# Altium footprint library Semicon-Discrete.pcblib: 205 footprints (part 7 of 13)
Each footprint in its own frame and in the unit in brackets; x right, y up, seen from the top. Pads: shape width x height; smd on the part's side, far side on the other; paste and mask are expansions set on the pad; w line width, h text height; cw(c..) or ccw(c..) is an arc to the next point about the centre after c.
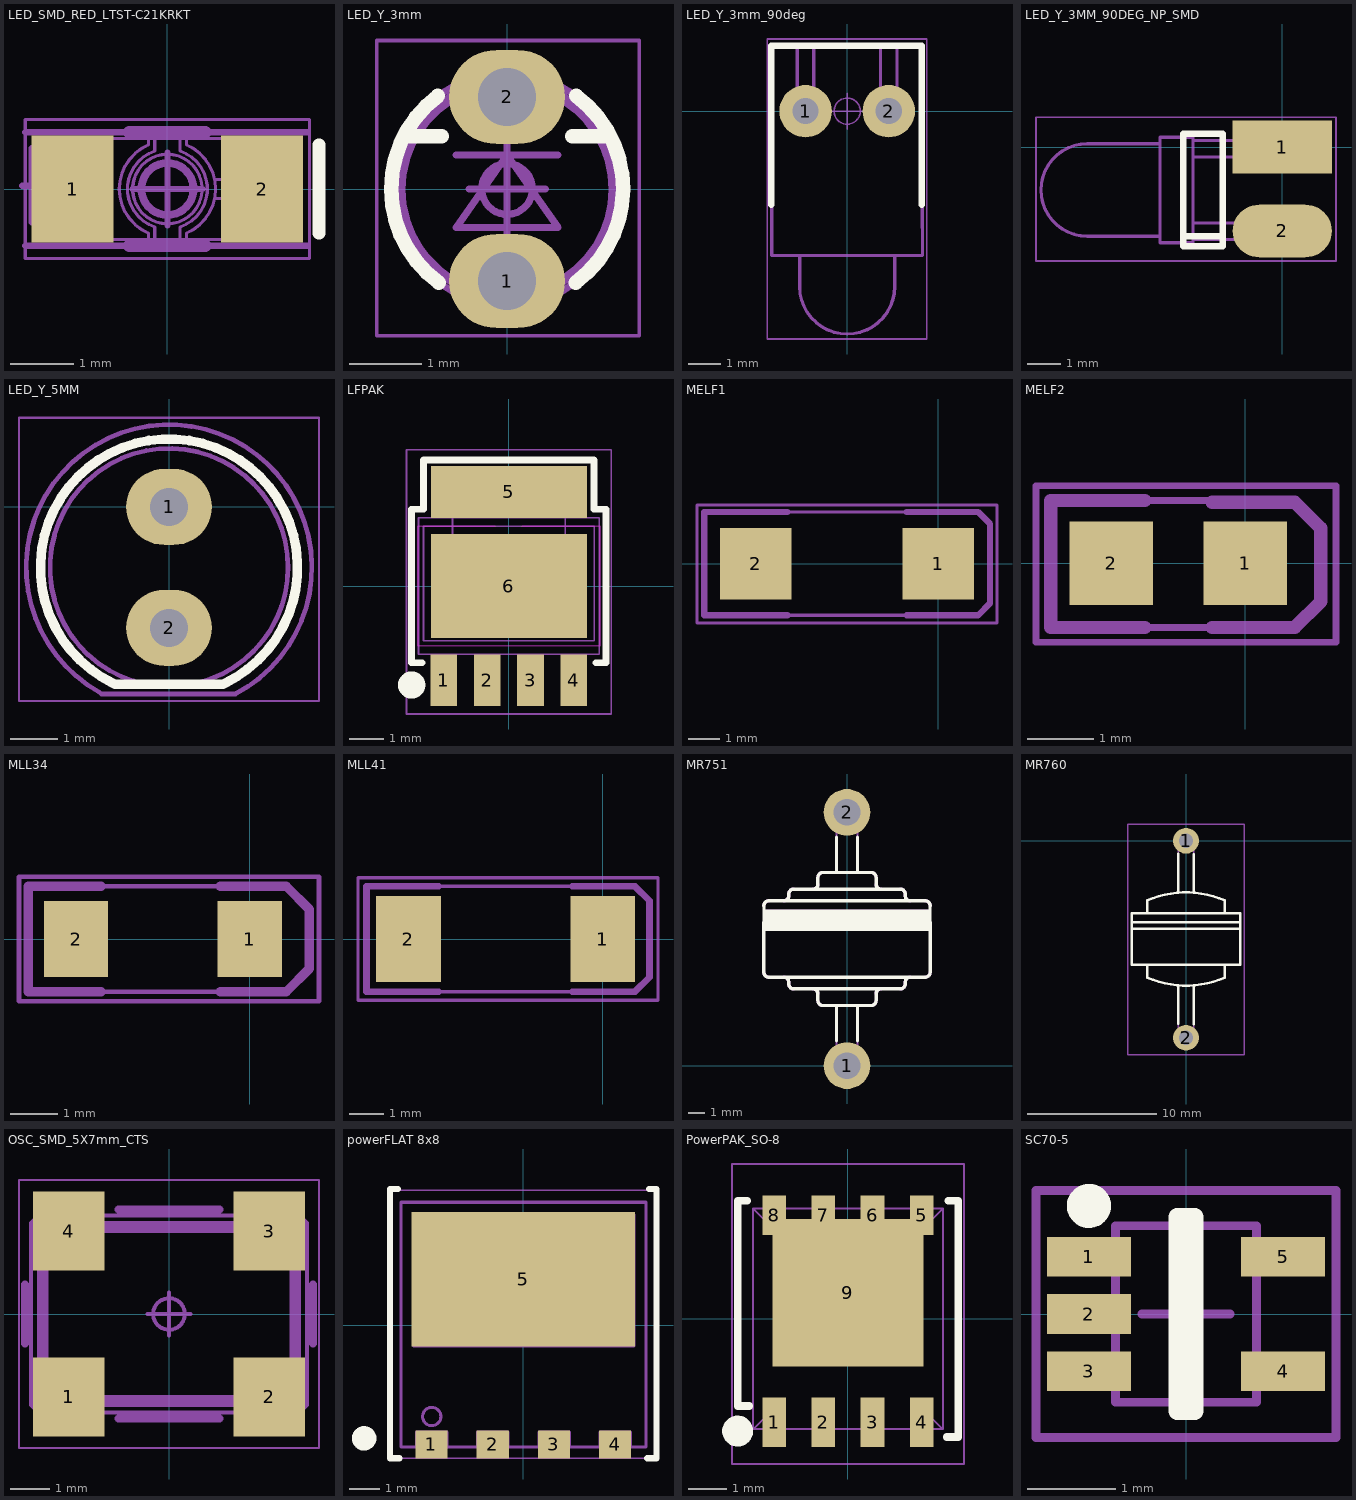
[diagram p6: the footprints below, top view; thin cyan lines are the x and y axes]

## LED_SMD_RED_LTST-C21KRKT [mm] "SMT,LED,1206,RED,Lite-On Inc. LTST-C21KRKT"
height 1.1
pads (2):
  rect 1.3x1.7 smd: 1(-1.5,0) 2(1.5,0)
TopOverlay:
  lines w0.2: 2.4,-0.7 2.4,0.7
2-TopCompOutl:
  lines w0.05: -1.7,-0.4 -1.7,0.5 ; -1,-0.8 -1,-0.7 ; -1,-0.6 -1,-0.4 ; -1,-0.3 -1,-0.1 ; -1,0 -1,0.2 ; -1,0.3 -1,0.5 ; -1,0.6 -1,0.8 ; -0.3,-0.8 -0.3,-0.7 cw(c0,0) -0.3,0.7 -0.3,0.8 ; -0.2,-0.8 -0.2,-0.6 cw(c0,0) -0.2,0.6 -0.2,0.8 ; 0.2,-0.8 0.2,-0.6 ccw(c0,0) 0.2,0.6 0.2,0.8 ; 0.3,-0.8 0.3,-0.7 ccw(c0,0) 0.3,0.7 0.3,0.8 ; 0.75,-0.15 1,-0.15 ; 0.75,0.15 1,0.15 ; 1,-0.8 1,-0.7 ; 1,-0.6 1,-0.4 ; 1,-0.3 1,-0.1 ; 1,0 1,0.2 ; 1,0.3 1,0.5 ; 1,0.6 1,0.8 ; -2.05,-0.4 -1.7,0.05 -2.05,0.5 -2.05,0.05 -2.05,-0.4 ; -1.6,-0.8 0,-0.8 1.6,-0.8 1.6,0 1.6,0.8 0,0.8 -1.6,0.8 -1.6,0 -1.6,-0.8 ; 0,-0.55 ccw(c0,0) 0,0.55 ccw(c0,0) 0,-0.55 ; 0,-0.45 ccw(c0,0) 0,0.45 ccw(c0,0) 0,-0.45
4-TopCourty:
  circle w0.1: c0,0 r0.4
  lines w0.05: -2.25,-1.1 -2.25,1.1 2.25,1.1 2.25,-1.1 -2.25,-1.1
  lines w0.1: -0.55,0 0.55,0 ; 0,-0.575 0,0.575
7-TopAssy:
  lines w0.1: -2.3,0.05 -1.45,0.05 ; -2.25,-0.9 2.225,-0.9 ; -2.25,0.9 2.225,0.9 ; -1.65,-0.55 -1.65,0.65 ; -2.15,-0.529 -2.15,0.15 -2.15,0.643 -1.694,0.057 -2.15,-0.529
  text ".Designator" at -1.3,-0.4 h1.6
13-SMDTopOverlay:
  lines w0.2: -0.6,-0.9 0.6,-0.9 ; -0.6,0.9 0.6,0.9
3D body "LED_SMD_RED_LTST-C21KRKT.STEP": height 1.1, standoff 0, extent -1.61,-0.8 1.61,0.8

## LED_Y_3mm [mm]
pads (2):
  oval 1.6x1.3 hole 0.8: 1(0,-1.27) 2(0,1.27)
TopOverlay:
  lines w0.2: -1.4,0.73 -0.9,0.73 ; -0.954,1.285 ccw(c0,0) -0.945,-1.291 ; 0.9,0.73 1.4,0.73 ; 0.945,-1.291 ccw(c0,0) 0.954,1.285
2-TopCompOutl:
  lines w0.1: -0.528,-1.404 cw(c0,0) 0.528,-1.404 ; -0.525,-1.405 0.525,-1.405
4-TopCourty:
  circle w0.1: c0,0 r0.35
  lines w0.05: -1.8,-2.025 1.825,-2.025 1.825,2.05 -1.8,2.05 -1.8,-2.025
  lines w0.1: -0.525,0 0.525,0 ; 0,-0.525 0,0.525
5-MCadOutl:
  lines w0.05: -0.3,0 0,0 ; 0,-0.229 0,0 ; 0,0.254 0,0 ; 0.3,0 0,0
7-TopAssy:
  circle w0.1: c0,-0.005 r1.45
  lines w0.1: -0.7,0.47 0.7,0.47 ; -0.563,-1.498 cw(c0,0) 0.563,-1.498 ; -0.55,-1.505 0.55,-1.505 ; 0,-0.83 0,0.87 ; -0.7,-0.53 0,0.47 0.7,-0.53 -0.7,-0.53 ; -0.25,-1.53 -0.25,-1.03 0.25,-1.03 0.25,-1.53 -0.25,-1.53 ; -0.25,1.02 0.25,1.02 0.25,1.52 -0.25,1.52 -0.25,1.02
  text ".Designator" at -1.65,2.35 h2.2
3D body "LED_Y_3mm.STEP": height 15.5, standoff -3.2, extent -1.597,-1.671 1.599,1.668

## LED_Y_3mm_90deg [mm]
pads (2):
  round 1.6 hole 0.8: 1(-1.27,0) 2(1.27,0)
TopOverlay:
  lines w0.2: -2.32,-2.85 -2.32,2 2.28,2 2.28,-2.85
2-TopCompOutl:
  drawing of 295 lines, arcs and shapes, not listed
4-TopCourty:
  circle w0.05: c0,0 r0.4
  lines w0.05: -0.575,0 0.575,0 ; 0,-0.55 0,0.55 ; -2.44,-6.95 -2.44,2.2 2.43,2.2 2.43,-6.95 -2.44,-6.95
7-TopAssy:
  lines w0.1: -1.45,-5.4 -1.45,-4.4 ; -1.45,-5.35 ccw(c0,-5.35) 1.45,-5.35 ; 1.45,-5.4 1.45,-4.4 ; -2.3,-4.4 2.3,-4.4 2.3,2 -2.3,2 -2.3,-4.4
  text ".Designator" at 0.53,-3.45 h2.2
3D body "LED_Y_3mm_90deg.STEP": height 7.3, standoff -3.5, extent -2.3,-6.8 2.3,1.95

## LED_Y_3MM_90DEG_NP_SMD [mm]
height 3
pads (2):
  rect 3x1.6 smd: 1(0,0)
  oval 3x1.6 smd: 2(0,-2.54)
TopOverlay:
  lines w0.2: -3,-2.7 -1.8,-2.7 ; -3,-3 -3,0.4 -1.8,0.4 -1.8,0 -1.8,-3 -3,-3
2-TopCompOutl:
  lines w0.1: -3.7,-2.7 -5.9,-2.7 cw(c-5.9,-1.3) -5.9,0.1 -3.7,0.1 -3.7,0.3 -2.7,0.3 -2.7,-2.9 -3.7,-2.9 -3.7,0.2 ; -2.7,-2.8 0.7,-2.8 0.7,-2.3 -2.7,-2.3 ; -2.7,-0.3 0.7,-0.3 0.7,0.2 -2.7,0.2
4-TopCourty:
  circle w0.1: c0,0 r0.4
  lines w0.05: -7.45,-3.45 1.625,-3.45 1.625,0.9 -7.45,0.9 -7.45,-3.45
  lines w0.1: -0.55,0 0.55,0 ; 0,-0.575 0,0.575
7-TopAssy:
  lines w0.1: -3.7,-2.7 -5.9,-2.7 cw(c-5.9,-1.3) -5.9,0.1 -3.7,0.1 -3.7,0.3 -2.7,0.3 -2.7,-2.9 -3.7,-2.9 -3.7,0.2 ; -2.7,-2.8 0.7,-2.8 0.7,-2.3 -2.7,-2.3 ; -2.7,-0.3 0.7,-0.3 0.7,0.2 -2.7,0.2
  text ".Designator" at -5.425,0.85 h2.2

## LED_Y_5MM [mm]
height 7
pads (2):
  oval 1.8x1.6 hole 0.8: 1(0,0) 2(0,-2.54)
TopOverlay:
  lines w0.2: -1.174,-3.701 cw(c0,-1.27) 1.174,-3.701 ; -1.14,-3.721 1.14,-3.721
  text ".Designator" at -2.2,2.02 h2.2
2-TopCompOutl:
  circle w0.1: c0,-1.27 r2.5
  lines w0.1: -1.454,-3.894 cw(c0,-1.27) 1.408,-3.919 ; -1.425,-3.925 1.4,-3.925
4-TopCourty:
  circle w0.1: c0,0 r0.35
  lines w0.05: -3.15,-4.075 -3.15,1.875 3.15,1.875 3.15,-4.075 -3.15,-4.075
  lines w0.1: -0.525,0 0.525,0 ; 0,-0.525 0,0.525
7-TopAssy:
  circle w0.1: c0,-1.27 r2.5
  lines w0.1: -1.454,-3.894 cw(c0,-1.27) 1.408,-3.919 ; -1.425,-3.925 1.4,-3.925
  text ".Designator" at -2.2,-1.9 h2.2
3D body "LED_Y_5mm.STEP": height 8.9, standoff -3.2, extent -2.793,-3.79 2.8,1.54

## LFPAK [mm] "LFPAK,SC-100"
height 1.1
pads (6):
  rect 0.78x1.52 smd: 1(-1.905,-2.76) 2(-0.635,-2.76) 3(0.635,-2.76) 4(1.905,-2.76)
  rect 4.57x1.52 smd: 5(0,2.76)
  rect 4.57x3.04 smd: 6(0,0)
TopLayer keep-out:
  lines w0.05: -0.4,1.75 -2.675,1.75 -2.675,-1.75 -0.025,-1.75 2.675,-1.75 2.675,1.75 0.4,1.75
TopOverlay:
  circle w0.4: c-2.85,-2.9 r0.2
  lines w0.2: -2.55,-2.25 -2.85,-2.25 -2.85,2.25 -2.5,2.25 -2.5,3.7 2.5,3.7 2.5,2.25 2.85,2.25 2.85,-2.25 2.55,-2.25
2-TopCompOutl:
  circle w0.05: c-1.85,-0.65 r0.4
  lines w0.05: -2.1,-3.1 -1.7,-3.1 ; -2.1,-2.7 -1.7,-2.7 ; -2.1,-2 -2.1,-3.3 -1.7,-3.3 -1.7,-2 ; -1.85,2 -1.85,2.25 -2,2.25 -2,2.9 ; -0.85,-3.1 -0.45,-3.1 ; -0.85,-2.7 -0.45,-2.7 ; -0.85,-2 -0.85,-3.3 -0.45,-3.3 -0.45,-2 ; -0.1,-1.6 2.5,-1.6 2.5,1.75 -0.1,1.75 ; 0.1,-1.6 -2.5,-1.6 -2.5,1.75 0.1,1.75 ; 0.45,-3.1 0.85,-3.1 ; 0.45,-2.7 0.85,-2.7 ; 0.45,-2 0.45,-3.3 0.85,-3.3 0.85,-2 ; 1.7,-3.1 2.1,-3.1 ; 1.7,-2.7 2.1,-2.7 ; 1.7,-2 1.7,-3.3 2.1,-3.3 2.1,-2 ; 1.85,2 1.85,2.25 2,2.25 2,2.9 ; -2,2.9 -1.9,3 0,3 1.9,3 2,2.9 ; -2,2.9 -2,2.9 ; 2,2.9 2,2.9 ; -2.65,-2 0,-2 2.65,-2 2.65,0 2.65,2 0,2 -2.65,2 -2.65,0 -2.65,-2
4-TopCourty:
  circle w0.1: c0,0 r0.35
  lines w0.05: -3,-3.75 -3,4 3,4 3,-3.75 -3,-3.75
  lines w0.1: -0.525,0 0.525,0 ; 0,-0.525 0,0.525
5-MCadOutl:
  lines w0.05: -2.15,2.15 -1.65,2.15 -1.65,-1.4 0,-1.4 1.65,-1.4 1.65,2.15 2.15,2.15 2.15,3.05 1.8,3.4 0,3.4 -1.8,3.4 -2.15,3.05 -2.15,2.15
7-TopAssy:
  circle w0.05: c-2,-1.05 r0.2
  lines w0.05: -2.1,-3.1 -1.7,-3.1 ; -2.1,-2.7 -1.7,-2.7 ; -2.1,-2 -2.1,-3.3 -1.7,-3.3 -1.7,-2 ; -1.85,2 -1.85,2.25 -2,2.25 -2,2.9 ; -0.85,-3.1 -0.45,-3.1 ; -0.85,-2.7 -0.45,-2.7 ; -0.85,-2 -0.85,-3.3 -0.45,-3.3 -0.45,-2 ; -0.1,-1.6 2.5,-1.6 2.5,1.75 -0.1,1.75 ; 0.1,-1.6 -2.5,-1.6 -2.5,1.75 0.1,1.75 ; 0.45,-3.1 0.85,-3.1 ; 0.45,-2.7 0.85,-2.7 ; 0.45,-2 0.45,-3.3 0.85,-3.3 0.85,-2 ; 1.7,-3.1 2.1,-3.1 ; 1.7,-2.7 2.1,-2.7 ; 1.7,-2 1.7,-3.3 2.1,-3.3 2.1,-2 ; 1.85,2 1.85,2.25 2,2.25 2,2.9 ; -2,2.9 -2,2.9 ; -2,2.9 -1.9,3 0,3 1.9,3 2,2.9 ; 2,2.9 2,2.9 ; -2.65,-2 -2.65,0 -2.65,2 0,2 2.65,2 2.65,0 2.65,-2 0,-2 -2.65,-2
  text ".Designator" at -2.3,-0.55 h2.2
3D body "LFPAK.STEP": height 1.1, standoff 0, extent -2.65,-3.2 2.65,3.05

## MELF1 [mil]
height 78.74
pads (2):
  rect 90x90 smd: 1(0,0) 2(-230,0)
4-TopCourty:
  circle w3.94: c0,0 r13.78
  lines w3.94: -20.67,0 20.67,0 ; 0,-20.67 0,20.67 ; -304.13,-74.8 -304.13,73.82 73.82,73.82 73.82,-74.8 -304.13,-74.8
7-TopAssy:
  lines w3.94: 49.21,-65 -295,-65 -295,65 49.21,65 ; 50,-65 65,-50 65,50 50,65
  text ".Designator" at -265.75,-25.59 h86.61
13-SMDTopOverlay:
  lines w7.87: -190,-65 -295,-65 -295,65 -190,65 ; -40,-65 50,-65 65,-50 65,50 50,65 -40,65

## MELF2 [mil]
height 78.74
pads (2):
  rect 50x50 smd: 1(0,0) 2(-80,0)
4-TopCourty:
  circle w3.94: c0,0 r13.78
  lines w3.94: -20.67,0 20.67,0 ; 0,-20.67 0,20.67 ; -125,-47.24 54.13,-47.24 54.13,46.26 -125,46.26 -125,-47.24
7-TopAssy:
  lines w3.94: -116.14,-38.39 29.53,-38.39 45.28,-22.64 45.28,20.67 28.54,37.4 -116.14,37.4 -116.14,-38.39
  text ".Designator" at -124.02,59.06 h86.61
13-SMDTopOverlay:
  lines w7.87: -60,-38.39 -116.14,-38.39 -116.14,37.4 -60,37.4 ; -20,-38.39 29.53,-38.39 45,-22.91 45,20.94 29.53,36.42 -20,36.42

## MLL34 [mil]
height 78.74
pads (2):
  rect 54x64 smd: 1(0,0) 2(-146,0)
4-TopCourty:
  circle w3.94: c0,0 r13.78
  lines w3.94: -20.67,0 20.67,0 ; 0,-20.67 0,20.67 ; -193.9,-52.17 -193.9,52.17 58.07,52.17 58.07,-52.17 -193.9,-52.17
7-TopAssy:
  lines w3.94: -186.02,-44.29 30.51,-44.29 50,-24.8 50,24.8 30.51,44.29 -186.02,44.29 -186.02,-43.31
  text ".Designator" at -181.1,-23.62 h86.61
13-SMDTopOverlay:
  lines w7.87: -186.02,-44.29 -125,-44.29 ; -186.02,-43.31 -186.02,44.29 -125,44.29 ; -25,-44.29 30.51,-44.29 50,-24.8 50,24.8 30.51,44.29 -25,44.29

## MLL41 [mm]
height 2
pads (2):
  rect 1.905x2.54 smd: 1(0,0) 2(-5.715,0)
4-TopCourty:
  circle w0.1: c0,0 r0.35
  lines w0.1: -0.525,0 0.525,0 ; 0,-0.525 0,0.525 ; -7.2,-1.8 1.625,-1.8 1.625,1.8 -7.2,1.8 -7.2,-1.8
7-TopAssy:
  lines w0.1: -6.95,-1.55 -6.95,1.55 0.95,1.55 1.375,1.125 1.375,-1.125 0.95,-1.55 -6.95,-1.55
  text ".Designator" at -5.55,-0.625 h2.2
13-SMDTopOverlay:
  lines w0.2: -4.826,-1.55 -6.95,-1.55 -6.95,1.55 -4.826,1.55 ; -0.889,-1.55 0.95,-1.55 1.375,-1.125 1.375,1.125 0.95,1.55 -0.889,1.55

## MR751 [mm]
height 10
pads (2):
  round 2.8 hole 1.6: 1(0,0) 2(0,15.24)
TopOverlay:
  region: 5,8.1 5,9.4 -4.9,9.4 -4.9,8.1
  lines w0.2: -5,9.62 cw(c-4.7,9.62) -4.7,9.92 4.7,9.92 cw(c4.7,9.62) 5,9.62 ; -4.99,8.62 -4.99,9.62 ; -3.8,5.32 cw(c-3.8,5.02) -3.5,5.02 -3.5,4.92 ccw(c-3.2,4.92) -3.2,4.62 3.2,4.62 ccw(c3.2,4.92) 3.5,4.92 3.5,5.02 cw(c3.8,5.02) 3.8,5.32 ; -3.8,9.92 ccw(c-3.8,10.22) -3.5,10.22 -3.5,10.32 cw(c-3.2,10.32) -3.2,10.62 3.2,10.62 cw(c3.2,10.32) 3.5,10.32 3.5,10.22 ccw(c3.8,10.22) 3.8,9.92 ; -2.05,4.62 cw(c-2.05,4.32) -1.75,4.32 -1.75,3.92 ccw(c-1.45,3.92) -1.45,3.62 1.45,3.62 ccw(c1.45,3.92) 1.75,3.92 1.75,4.32 cw(c2.05,4.32) 2.05,4.62 ; -2.05,10.62 ccw(c-2.05,10.92) -1.75,10.92 -1.75,11.32 cw(c-1.45,11.32) -1.45,11.62 1.45,11.62 cw(c1.45,11.32) 1.75,11.32 1.75,10.92 ccw(c2.05,10.92) 2.05,10.62 ; -0.635,1.5 -0.635,3.62 ; -0.635,11.62 -0.635,13.74 ; 0.635,1.5 0.635,3.62 ; 0.635,11.62 0.635,13.74 ; 4.99,8.62 4.99,9.62 ; -5,5.62 ccw(c-4.7,5.62) -4.7,5.32 4.7,5.32 ccw(c4.7,5.62) 5,5.62 5,8.62 -5,8.62 -5,5.62
4-TopCourty:
  circle w0.1: c0,0 r0.35
  lines w0.1: -0.525,0 0.525,0 ; 0,-0.525 0,0.525
7-TopAssy:
  region: 5,8.1 5,9.4 -4.9,9.4 -4.9,8.1
  lines w0.1: -5,5.62 -5,8.62 5,8.62 5,5.62 ; -4.99,8.62 -4.99,9.62 ; -4.7,5.32 4.7,5.32 ; -4.7,9.92 4.7,9.92 ; -3.5,4.92 -3.5,5.02 ; -3.5,10.22 -3.5,10.32 ; -3.2,4.62 3.2,4.62 ; -3.2,10.62 3.2,10.62 ; -1.75,3.92 -1.75,4.32 ; -1.75,10.92 -1.75,11.32 ; -1.45,3.62 1.45,3.62 ; -1.45,11.62 1.45,11.62 ; -0.635,3.62 -0.635,1.5 -0.635,0 ccw(c0,0) 0,-0.635 ccw(c0,0) 0.635,0 0.635,1.5 0.635,3.62 ; -0.635,11.62 -0.635,13.74 -0.635,15.24 cw(c0,15.24) 0,15.875 cw(c0,15.24) 0.635,15.24 0.635,13.74 0.635,11.62 ; 1.75,3.92 1.75,4.32 ; 1.75,10.92 1.75,11.32 ; 3.5,4.92 3.5,5.02 ; 3.5,10.22 3.5,10.32 ; 4.99,8.62 4.99,9.62
  lines w0.2: -5,5.62 ccw(c-4.7,5.62) -4.7,5.32 ; -5,9.62 cw(c-4.7,9.62) -4.7,9.92 ; -3.8,5.32 cw(c-3.8,5.02) -3.5,5.02 ; -3.8,9.92 ccw(c-3.8,10.22) -3.5,10.22 ; -3.5,4.92 ccw(c-3.2,4.92) -3.2,4.62 ; -3.5,10.32 cw(c-3.2,10.32) -3.2,10.62 ; -2.05,4.62 cw(c-2.05,4.32) -1.75,4.32 ; -2.05,10.62 ccw(c-2.05,10.92) -1.75,10.92 ; -1.75,3.92 ccw(c-1.45,3.92) -1.45,3.62 ; -1.75,11.32 cw(c-1.45,11.32) -1.45,11.62 ; 1.45,3.62 ccw(c1.45,3.92) 1.75,3.92 ; 1.45,11.62 cw(c1.45,11.32) 1.75,11.32 ; 1.75,4.32 cw(c2.05,4.32) 2.05,4.62 ; 1.75,10.92 ccw(c2.05,10.92) 2.05,10.62 ; 3.2,4.62 ccw(c3.2,4.92) 3.5,4.92 ; 3.2,10.62 cw(c3.2,10.32) 3.5,10.32 ; 3.5,5.02 cw(c3.8,5.02) 3.8,5.32 ; 3.5,10.22 ccw(c3.8,10.22) 3.8,9.92 ; 4.7,5.32 ccw(c4.7,5.62) 5,5.62 ; 4.7,9.92 cw(c4.7,9.62) 5,9.62
  text ".Designator" at -4,6.2 h2.2

## MR760 [mm]
pads (2):
  round 2 hole 1.1: 1(0,0) 2(0,-15.24)
TopOverlay:
  lines w0.2: -4.2,-6.8 4.1,-6.8 ; -4.2,-6.3 4.2,-6.3 ; -3.008,-4.614 cw(c0,-11.6) 2.996,-4.609 ; -3,-10.6 -3,-9.6 ; -3,-5.6 -3,-4.6 ; -2.996,-10.591 ccw(c0,-3.6) 3.008,-10.586 ; -0.6,-14.15 -0.6,-11.2 ; -0.6,-4 -0.6,-1.025 ; 0.6,-14.175 0.6,-11.2 ; 0.6,-4 0.6,-1.05 ; 3,-10.6 3,-9.6 ; 3,-5.6 3,-4.6 ; -4.2,-9.6 4.2,-9.6 4.2,-5.6 -4.2,-5.6 -4.2,-9.6
2-TopCompOutl:
  lines w0.1: -4.2,-6.8 4.1,-6.8 ; -4.2,-6.3 4.2,-6.3 ; -3.008,-4.614 cw(c0,-11.6) 2.996,-4.609 ; -3,-10.6 -3,-9.6 ; -3,-5.6 -3,-4.6 ; -2.996,-10.591 ccw(c0,-3.6) 3.008,-10.586 ; -0.6,-15.2 ccw(c0,-15.2) 0.6,-15.2 ; -0.6,-15.2 -0.6,-11.2 ; -0.6,-4 -0.6,0 cw(c0,0) 0.6,0 0.6,-4 ; 0.6,-15.2 0.6,-11.2 ; 3,-10.6 3,-9.6 ; 3,-5.6 3,-4.6 ; -4.2,-9.6 -4.2,-5.6 4.2,-5.6 4.2,-9.6 -4.2,-9.6
4-TopCourty:
  circle w0.1: c0,0 r0.35
  lines w0.1: -0.525,0 0.525,0 ; 0,-0.525 0,0.525 ; -4.5,-16.55 4.525,-16.55 4.525,1.275 -4.5,1.275 -4.5,-16.55
7-TopAssy:
  lines w0.1: -4.2,-6.8 4.1,-6.8 ; -4.2,-6.3 4.2,-6.3 ; -3.008,-4.614 cw(c0,-11.6) 2.996,-4.609 ; -3,-10.6 -3,-9.6 ; -3,-5.6 -3,-4.6 ; -2.996,-10.591 ccw(c0,-3.6) 3.008,-10.586 ; -0.6,-15.2 ccw(c0,-15.2) 0.6,-15.2 ; -0.6,-15.2 -0.6,-11.2 ; -0.6,-4 -0.6,0 cw(c0,0) 0.6,0 0.6,-4 ; 0.6,-15.2 0.6,-11.2 ; 3,-10.6 3,-9.6 ; 3,-5.6 3,-4.6 ; -4.2,-9.6 4.2,-9.6 4.2,-5.6 -4.2,-5.6 -4.2,-9.6
  text ".Designator" at -1.5,-8.625 h2.2

## OSC_SMD_5X7mm_CTS [mm] "SMD OSC CTS 5X7mm Bpdy, CB3 Series"
height 1.7
pads (4):
  rect 1.8x2 smd: 1(-2.54,-2.1) 2(2.54,-2.1) 3(2.54,2.1) 4(-2.54,2.1)
2-TopCompOutl:
  lines w0.1: -2.615,-2.3 ccw(c-2.615,-2.35) -2.665,-2.35 -2.665,-2.5 -3.3,-2.5 -3.5,-2.3 -3.5,2.3 -3.3,2.5 -2.665,2.5 -2.665,2.35 ccw(c-2.615,2.35) -2.615,2.3 ; -2.465,-2.3 cw(c-2.465,-2.35) -2.415,-2.35 -2.415,-2.5 2.415,-2.5 2.415,-2.35 cw(c2.465,-2.35) 2.465,-2.3 ; -2.465,2.3 ccw(c-2.465,2.35) -2.415,2.35 -2.415,2.5 2.415,2.5 2.415,2.35 ccw(c2.465,2.35) 2.465,2.3 ; 2.615,-2.3 cw(c2.615,-2.35) 2.665,-2.35 2.665,-2.5 3.3,-2.5 3.5,-2.3 3.5,2.3 3.3,2.5 2.665,2.5 2.665,2.35 cw(c2.615,2.35) 2.615,2.3 ; -3.3,-2 ccw(c-3,-2) -3,-2.3 ; -3.3,-2 -3.1,-2 ; -3.3,-2 -3.3,2 ; -3.3,2 cw(c-3,2) -3,2.3 ; -3.3,2 -3.1,2 ; -3.1,-2 ccw(c-3,-2) -3,-2.1 ; -3.1,-2 -3.1,2 ; -3.1,2 cw(c-3,2) -3,2.1 ; -3,-2.3 -3,-2.1 ; -3,-2.3 3,-2.3 ; -3,-2.1 3,-2.1 ; -3,2.1 3.3,2.1 ; -3,2.1 -3,2.3 ; -3,2.3 3.1,2.3 ; 3,-2.3 ccw(c3,-2) 3.3,-2 ; 3,-2.3 3,-2.1 ; 3,-2.1 ccw(c3,-2) 3.1,-2 ; 3.1,-2 3.3,-2 ; 3.1,-2 3.1,2.3 ; 3.1,2.3 cw(c3.1,2.1) 3.3,2.1 ; 3.3,-2 3.3,2.1 ; -3.2,-2 ccw(c-3,-2) -3,-2.2 3,-2.2 ccw(c3,-2) 3.2,-2 3.2,2.1 ccw(c3.1,2.1) 3.1,2.2 -3,2.2 ccw(c-3,2) -3.2,2 -3.2,-2 ; -2.85,-1.85 -2.55,-1.85 -2.55,-1.55 -2.85,-1.55 -2.85,-1.85
4-TopCourty:
  circle w0.1: c0,0 r0.4
  lines w0.05: -3.8,-3.4 -3.8,3.4 3.8,3.4 3.8,-3.4 -3.8,-3.4
  lines w0.1: -0.55,0 0.55,0 ; 0,-0.55 0,0.55
7-TopAssy:
  lines w0.1: -2.615,-2.3 ccw(c-2.615,-2.35) -2.665,-2.35 -2.665,-2.5 -3.3,-2.5 -3.5,-2.3 -3.5,2.3 -3.3,2.5 -2.665,2.5 -2.665,2.35 ccw(c-2.615,2.35) -2.615,2.3 ; -2.465,-2.3 cw(c-2.465,-2.35) -2.415,-2.35 -2.415,-2.5 2.415,-2.5 2.415,-2.35 cw(c2.465,-2.35) 2.465,-2.3 ; -2.465,2.3 ccw(c-2.465,2.35) -2.415,2.35 -2.415,2.5 2.415,2.5 2.415,2.35 ccw(c2.465,2.35) 2.465,2.3 ; 2.615,-2.3 cw(c2.615,-2.35) 2.665,-2.35 2.665,-2.5 3.3,-2.5 3.5,-2.3 3.5,2.3 3.3,2.5 2.665,2.5 2.665,2.35 cw(c2.615,2.35) 2.615,2.3 ; -3.3,-2 ccw(c-3,-2) -3,-2.3 ; -3.3,-2 -3.3,2 ; -3.3,-2 -3.1,-2 ; -3.3,2 cw(c-3,2) -3,2.3 ; -3.3,2 -3.1,2 ; -3.1,-2 ccw(c-3,-2) -3,-2.1 ; -3.1,-2 -3.1,2 ; -3.1,2 cw(c-3,2) -3,2.1 ; -3,-2.3 3,-2.3 ; -3,-2.3 -3,-2.1 ; -3,-2.1 3,-2.1 ; -3,2.1 -3,2.3 ; -3,2.1 3.3,2.1 ; -3,2.3 3.1,2.3 ; 3,-2.3 ccw(c3,-2) 3.3,-2 ; 3,-2.3 3,-2.1 ; 3,-2.1 ccw(c3,-2) 3.1,-2 ; 3.1,-2 3.1,2.3 ; 3.1,-2 3.3,-2 ; 3.1,2.3 cw(c3.1,2.1) 3.3,2.1 ; 3.3,-2 3.3,2.1 ; -3.2,-2 ccw(c-3,-2) -3,-2.2 3,-2.2 ccw(c3,-2) 3.2,-2 3.2,2.1 ccw(c3.1,2.1) 3.1,2.2 -3,2.2 ccw(c-3,2) -3.2,2 -3.2,-2 ; -2.85,-1.85 -2.85,-1.55 -2.55,-1.55 -2.55,-1.85 -2.85,-1.85
  text ".Designator" at -2.35,-0.375 h1.5
13-SMDTopOverlay:
  lines w0.2: -3.65,-0.75 -3.65,0.75 ; -1.275,-2.65 1.275,-2.65 ; -1.275,2.65 1.275,2.65 ; 3.65,-0.75 3.65,0.75
  text "1" at -4.05,-2.6 h1.52
3D body "OSC_SMD_5X7mm_CTS.STEP": height 1.6, standoff 0, extent -3.5,-2.5 3.5,2.5

## powerFLAT 8x8 [mm] "powerFLAT 8x8 Exposed Pad 4 x 7mm"
height 1
pads (5):
  rect 1.05x0.9 smd: 1(-3,-3.9) 2(-1,-3.9) 3(1,-3.9) 4(3,-3.9)
  rect 7.3x4.4 smd: 5(0,1.5)
TopOverlay:
  circle w0.4: c-5.2,-3.7 r0.2
  lines w0.2: -4.1,4.45 -4.35,4.45 -4.35,-4.35 -4.05,-4.35 ; 4.05,-4.35 4.35,-4.35 4.35,4.45 4.1,4.45
2-TopCompOutl:
  circle w0.1: c-2.993,-2.986 r0.3
  circle w0.1: c-2.993,-2.986 r0.3
  lines w0.1: -3.993,-3.986 4.007,-3.986 ; -3.993,-3.986 -3.493,-3.986 ; -3.993,-3.986 -3.993,4.014 4.007,4.014 4.007,-3.986 ; -3.493,-3.996 -2.493,-3.996 ; -3.493,-3.996 -3.493,-3.496 ; -3.493,-3.996 -3.493,-3.986 ; -3.493,-3.986 -2.493,-3.986 ; -3.493,-3.986 -3.493,-3.496 ; -3.493,-3.496 -2.493,-3.496 ; -2.493,-3.996 -2.493,-3.496 ; -2.493,-3.996 -2.493,-3.986 ; -2.493,-3.986 -1.493,-3.986 ; -2.493,-3.986 -2.493,-3.496 ; -1.493,-3.996 -0.493,-3.996 ; -1.493,-3.996 -1.493,-3.986 ; -1.493,-3.996 -1.493,-3.496 ; -1.493,-3.986 -0.493,-3.986 ; -1.493,-3.986 -1.493,-3.496 ; -1.493,-3.496 -0.493,-3.496 ; -0.493,-3.996 -0.493,-3.496 ; -0.493,-3.996 -0.493,-3.986 ; -0.493,-3.986 -0.493,-3.496 ; -0.493,-3.986 0.507,-3.986 ; 0.507,-3.996 1.507,-3.996 ; 0.507,-3.996 0.507,-3.986 ; 0.507,-3.996 0.507,-3.496 ; 0.507,-3.986 1.507,-3.986 ; 0.507,-3.986 0.507,-3.496 ; 0.507,-3.496 1.507,-3.496 ; 1.507,-3.996 1.507,-3.496 ; 1.507,-3.996 1.507,-3.986 ; 1.507,-3.986 2.507,-3.986 ; 1.507,-3.986 1.507,-3.496 ; 2.507,-3.996 3.507,-3.996 ; 2.507,-3.996 2.507,-3.986 ; 2.507,-3.996 2.507,-3.496 ; 2.507,-3.986 3.507,-3.986 ; 2.507,-3.986 2.507,-3.496 ; 2.507,-3.496 3.507,-3.496 ; 3.507,-3.996 3.507,-3.986 ; 3.507,-3.996 3.507,-3.496 ; 3.507,-3.986 3.507,-3.496 ; 3.507,-3.986 4.007,-3.986 ; -3.593,-0.686 -3.593,3.614 3.607,3.614 3.607,-0.686 -3.593,-0.686
4-TopCourty:
  circle w0.1: c0,0 r0.35
  lines w0.05: -4.35,-4.35 4.4,-4.35 4.4,4.4 -4.35,4.4 -4.35,-4.35
  lines w0.1: -0.525,0 0.525,0 ; 0,-0.525 0,0.525
7-TopAssy:
  circle w0.1: c-2.993,-2.986 r0.3
  circle w0.1: c-2.993,-2.986 r0.3
  lines w0.1: -3.993,-3.986 -3.993,4.014 4.007,4.014 4.007,-3.986 ; -3.993,-3.986 -3.493,-3.986 ; -3.993,-3.986 4.007,-3.986 ; -3.493,-3.996 -3.493,-3.986 ; -3.493,-3.996 -3.493,-3.496 ; -3.493,-3.996 -2.493,-3.996 ; -3.493,-3.986 -3.493,-3.496 ; -3.493,-3.986 -2.493,-3.986 ; -3.493,-3.496 -2.493,-3.496 ; -2.493,-3.996 -2.493,-3.986 ; -2.493,-3.996 -2.493,-3.496 ; -2.493,-3.986 -2.493,-3.496 ; -2.493,-3.986 -1.493,-3.986 ; -1.493,-3.996 -1.493,-3.496 ; -1.493,-3.996 -1.493,-3.986 ; -1.493,-3.996 -0.493,-3.996 ; -1.493,-3.986 -1.493,-3.496 ; -1.493,-3.986 -0.493,-3.986 ; -1.493,-3.496 -0.493,-3.496 ; -0.493,-3.996 -0.493,-3.986 ; -0.493,-3.996 -0.493,-3.496 ; -0.493,-3.986 0.507,-3.986 ; -0.493,-3.986 -0.493,-3.496 ; 0.507,-3.996 0.507,-3.496 ; 0.507,-3.996 0.507,-3.986 ; 0.507,-3.996 1.507,-3.996 ; 0.507,-3.986 0.507,-3.496 ; 0.507,-3.986 1.507,-3.986 ; 0.507,-3.496 1.507,-3.496 ; 1.507,-3.996 1.507,-3.986 ; 1.507,-3.996 1.507,-3.496 ; 1.507,-3.986 1.507,-3.496 ; 1.507,-3.986 2.507,-3.986 ; 2.507,-3.996 2.507,-3.496 ; 2.507,-3.996 2.507,-3.986 ; 2.507,-3.996 3.507,-3.996 ; 2.507,-3.986 2.507,-3.496 ; 2.507,-3.986 3.507,-3.986 ; 2.507,-3.496 3.507,-3.496 ; 3.507,-3.996 3.507,-3.496 ; 3.507,-3.996 3.507,-3.986 ; 3.507,-3.986 4.007,-3.986 ; 3.507,-3.986 3.507,-3.496 ; -3.593,-0.686 3.607,-0.686 3.607,3.614 -3.593,3.614 -3.593,-0.686
  text ".Designator" at -2.65,0.2 h2.2
3D body "powerFLAT 8x8.STEP": height 0.95, standoff 0, extent -4,-4.01 4,4

## PowerPAK_SO-8 [mm] "PowerPAK® SO-8 - Power Pack Exposed Pad 5 x 6mm"
height 1.1
pads (9):
  rect 0.61x1.27 smd: 1(-1.905,-2.67) 2(-0.635,-2.67) 3(0.635,-2.67) 4(1.905,-2.67)
  rect 0.61x1.02 smd: 5(1.905,2.67) 6(0.635,2.67) 7(-0.635,2.67) 8(-1.905,2.67)
  rect 3.91x3.81 smd: 9(0,0.68)
TopOverlay:
  circle w0.4: c-2.85,-2.9 r0.2
  lines w0.2: -2.6,3.05 -2.85,3.05 -2.85,-2.25 -2.55,-2.25 ; 2.55,-3.05 2.85,-3.05 2.85,3.05 2.6,3.05
2-TopCompOutl:
  circle w0.1: c-1.912,-2.35 r0.112
  lines w0.05: -2.1,-2.5 -2.45,-2.85 ; -2.1,2.5 -2.45,2.85 ; -2.05,-2.85 -2.05,-3 -1.8,-3 -1.8,-2.85 ; -2.05,2.85 -2.05,3 -1.8,3 -1.8,2.85 ; -0.75,-2.85 -0.75,-3 -0.5,-3 -0.5,-2.85 ; -0.75,2.85 -0.75,3 -0.5,3 -0.5,2.85 ; 0.5,-2.85 0.5,-3 0.75,-3 0.75,-2.85 ; 0.5,2.85 0.5,3 0.75,3 0.75,2.85 ; 1.8,-2.85 1.8,-3 2.05,-3 2.05,-2.85 ; 1.8,2.85 1.8,3 2.05,3 2.05,2.85 ; 2.1,-2.5 2.45,-2.85 ; 2.1,2.5 2.45,2.85 ; -2.45,-2.85 -2.45,0 -2.45,2.85 ; -2.45,-2.85 0,-2.85 2.45,-2.85 ; -2.45,2.85 0,2.85 2.45,2.85 ; 2.45,-2.85 2.45,0 2.45,2.85
4-TopCourty:
  circle w0.1: c0,0 r0.35
  lines w0.05: -3,-3.75 3,-3.75 3,4 -3,4 -3,-3.75
  lines w0.1: -0.525,0 0.525,0 ; 0,-0.525 0,0.525
7-TopAssy:
  circle w0.1: c-1.912,-2.35 r0.112
  lines w0.05: -2.1,-2.5 -2.45,-2.85 ; -2.1,2.5 -2.45,2.85 ; -2.05,-2.85 -2.05,-3 -1.8,-3 -1.8,-2.85 ; -2.05,2.85 -2.05,3 -1.8,3 -1.8,2.85 ; -0.75,-2.85 -0.75,-3 -0.5,-3 -0.5,-2.85 ; -0.75,2.85 -0.75,3 -0.5,3 -0.5,2.85 ; 0.5,-2.85 0.5,-3 0.75,-3 0.75,-2.85 ; 0.5,2.85 0.5,3 0.75,3 0.75,2.85 ; 1.8,-2.85 1.8,-3 2.05,-3 2.05,-2.85 ; 1.8,2.85 1.8,3 2.05,3 2.05,2.85 ; 2.1,-2.5 2.45,-2.85 ; 2.1,2.5 2.45,2.85 ; -2.45,-2.85 0,-2.85 2.45,-2.85 ; -2.45,-2.85 -2.45,0 -2.45,2.85 ; -2.45,2.85 0,2.85 2.45,2.85 ; 2.45,-2.85 2.45,0 2.45,2.85
  text ".Designator" at -2.1,-0.6 h2.2
3D body "8TDFN EP 5x6.STEP": height 1, standoff 0, extent -2.45,-3 2.45,3

## SC70-5 [mm] "SOT23, 5-Leads, Body 1.2x2mm, Pitch 0,65mm, IPC Medium Density"
height 1.1
pads (5):
  rect 0.95x0.45 smd: 1(-1.1,0.65) 2(-1.1,0) 3(-1.1,-0.65) 4(1.1,-0.65) 5(1.1,0.65)
TopOverlay:
  circle w0.25: c-1.1,1.225 r0.125
  lines w0.2: -0.1,-1.1 0.1,-1.1 0.1,1.1 -0.1,1.1 -0.1,-1.1
2-TopCompOutl:
  lines w0.1: -0.8,-0.8 -1.3,-0.8 -1.3,-0.5 -0.8,-0.5 ; -0.8,-0.15 -1.3,-0.15 -1.3,0.15 -0.8,0.15 ; -0.8,0.5 -1.3,0.5 -1.3,0.8 -0.8,0.8 ; 0.8,-0.8 1.3,-0.8 1.3,-0.5 0.8,-0.5 ; 0.8,0.5 1.3,0.5 1.3,0.8 0.8,0.8 ; -0.8,-1 0.8,-1 0.8,1 0,1 -0.8,1 -0.8,-1
4-TopCourty:
  lines w0.1: -0.5,0 0.5,0 ; 0,-0.5 0,0.5 ; -1.7,-1.4 -1.7,1.4 1.7,1.4 1.7,-1.4 -1.7,-1.4
7-TopAssy:
  lines w0.1: -0.8,-1 -0.8,1 ; -0.8,-0.8 -1.3,-0.8 -1.3,-0.5 -0.8,-0.5 ; -0.8,-0.15 -1.3,-0.15 -1.3,0.15 -0.8,0.15 ; -0.8,0.5 -1.3,0.5 -1.3,0.8 -0.8,0.8 ; 0.8,-1 0.8,1 ; 0.8,-0.8 1.3,-0.8 1.3,-0.5 0.8,-0.5 ; 0.8,0.5 1.3,0.5 1.3,0.8 0.8,0.8
  text ".Designator" at 0.5,-1.65 h1.6
3D body "SC70-5.STEP": height 1.2, standoff 0, extent -1.275,-1 1.275,1